# Altium footprint library ADNB95C.PcbLib: 249 footprints (part 13 of 16)
Each footprint in its own frame and in the unit in brackets; x right, y up, seen from the top. Pads: shape width x height; smd on the part's side, far side on the other; paste and mask are expansions set on the pad; w line width, h text height; cw(c..) or ccw(c..) is an arc to the next point about the centre after c.
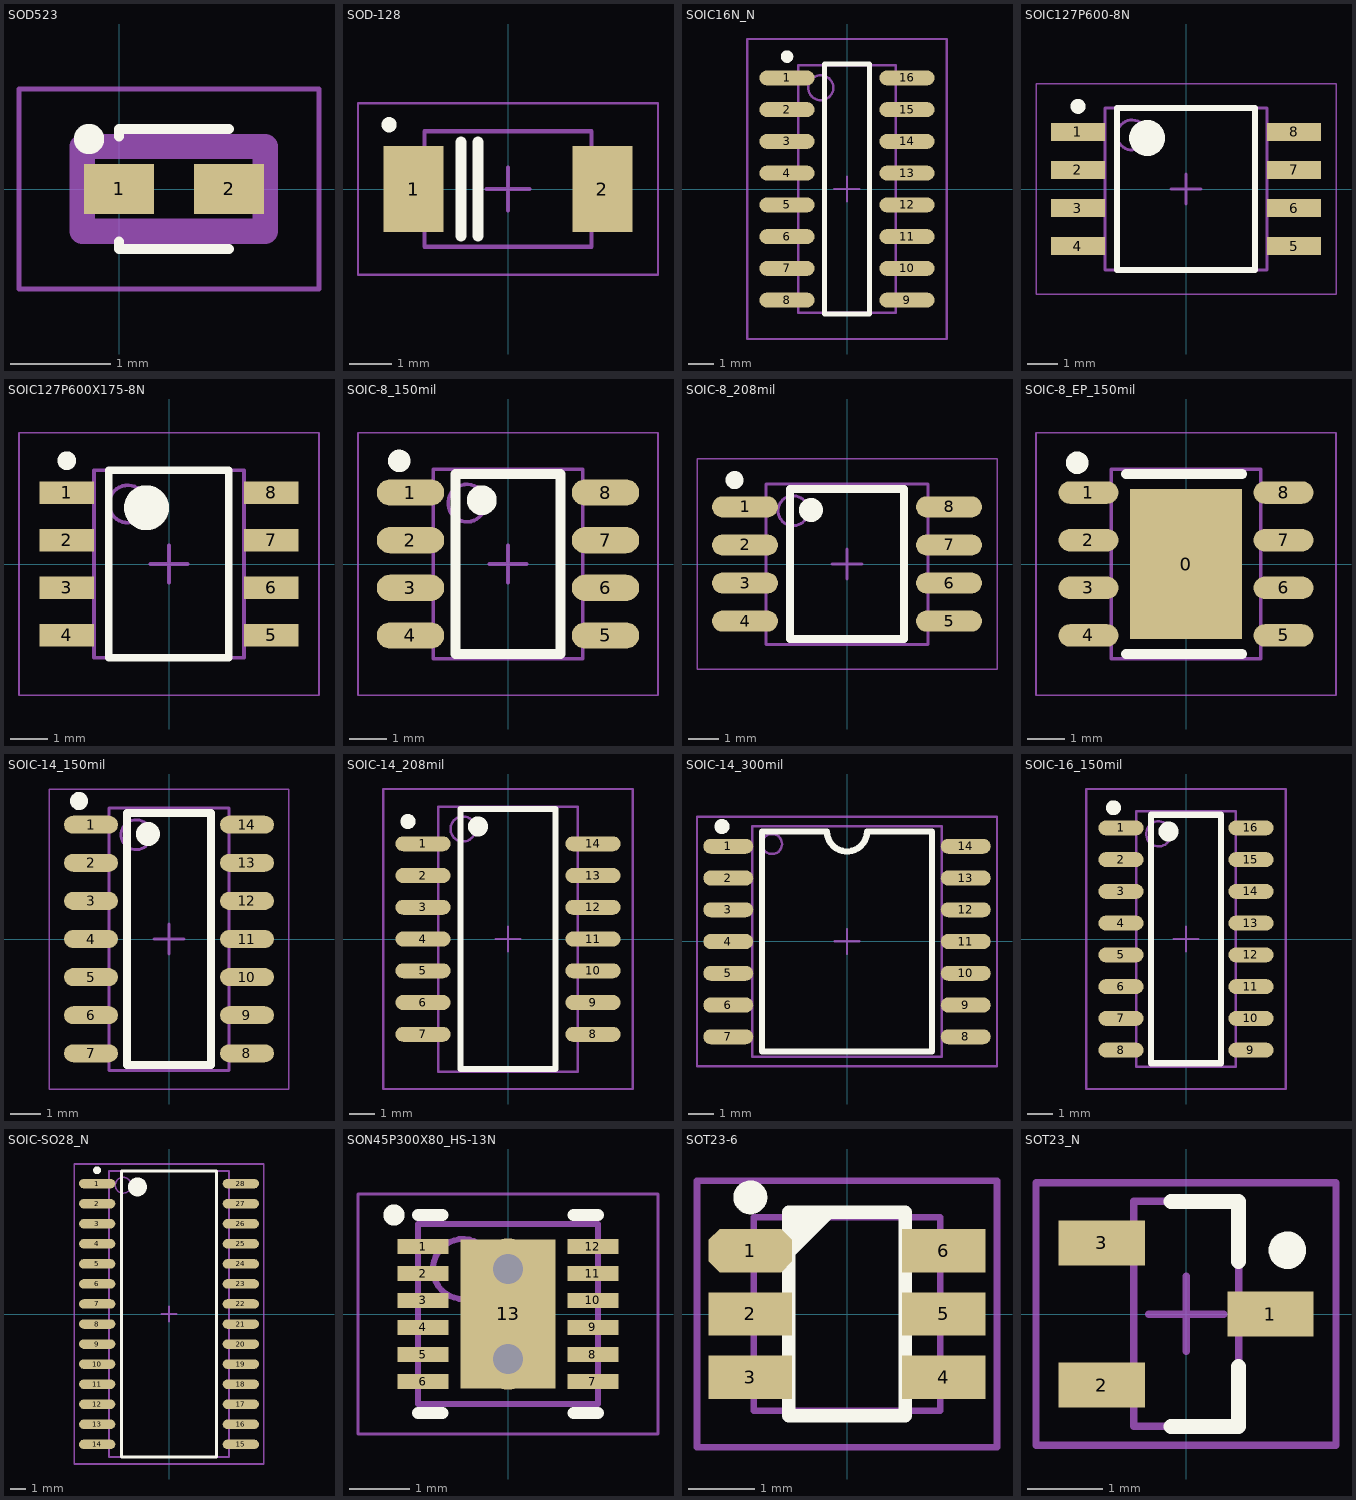
[diagram p12: the footprints below, top view; thin cyan lines are the x and y axes]

## SOD523 [mm]
height 11
pads (2):
  rect 0.7x0.5 smd: 1(0,0) 2(1.1,0)
Top Overlay:
  circle w0.254: c-0.3,0.5 r0.025
  lines w0.102: 0,-0.525 0,-0.6 1.1,-0.6 ; 0,0.525 0,0.6 1.1,0.6
Top Designator (Mech7):
  text ".Designator" at -3.809,-0.254 h0.76
Top Assembly:
  lines w0.254: -0.369,-0.424 -0.369,0.425 1.461,0.425 1.461,-0.424 -0.369,-0.424
Top Courtyard:
  lines w0.05: -1,-1 -1,1 2,1 2,-1 -1,-1
3D body "SW3dPS-SOD523.STEP": height 0.71, standoff 0, extent -0.369,-0.424 1.461,0.424

## SOD-128 [mm] "SODFL, 2-Leads, Body 2.50x4.70mm, IPC Medium Density"
height 1.05
pads (2):
  rect 1.4x2 smd: 1(-2.2,0) 2(2.2,0)
Top Overlay:
  circle w0.254: c-2.775,1.5 r0.05
  lines w0.254: -1.1,-1.1 -1.1,1.1 ; -0.7,-1.1 -0.7,1.1
Top Designator (Mech7):
  text ".Designator" at -6.094,-0.406 h1.22
Top Assembly:
  lines w0.1: -1.95,-1.35 -1.95,1.35 1.95,1.35 1.95,-1.35 -1.95,-1.35
Top Courtyard:
  lines w0.05: -3.5,-2 3.5,-2 3.5,2 -3.5,2 -3.5,-2
  lines w0.1: -0.5,0 0.5,0 ; 0,-0.5 0,0.5
3D body "User Library-SOD128.STEP": height 1.12, standoff 0.01, extent -2.5,-1.35 2.5,1.35

## SOIC16N_N [mm] "SOIC, 16-Leads, Body 9.9x3.9mm, Pitch 1.27mm, IPC Medium Density"
height 1.75
pads (16):
  oval 2.2x0.6 smd: 1(-2.4,4.445) 2(-2.4,3.175) 3(-2.4,1.905) 4(-2.4,0.635) 5(-2.4,-0.635) 6(-2.4,-1.905) 7(-2.4,-3.175) 8(-2.4,-4.445) 9(2.4,-4.445) 10(2.4,-3.175) 11(2.4,-1.905) 12(2.4,-0.635) 13(2.4,0.635) 14(2.4,1.905) 15(2.4,3.175) 16(2.4,4.445)
Top Overlay:
  circle w0.25: c-2.4,5.295 r0.125
  lines w0.2: -0.9,-5 -0.9,5 0.9,5 0.9,-5 -0.9,-5
Top Designator (Mech7):
  text ".Designator" at -7.618,-0.508 h1.52
Top Assembly:
  circle w0.1: c-1.05,4.05 r0.5
  lines w0.1: -1.95,-4.95 -1.95,4.95 1.95,4.95 1.95,-4.95 -1.95,-4.95
Top Courtyard:
  lines w0.1: -0.5,0 0.5,0 ; 0,-0.5 0,0.5 ; -4,-6 -4,6 4,6 4,-6 -4,-6
3D body "User Library-so16-2.STEP": height 1.78, standoff 0.01, extent -3.068,-4.985 3.068,4.985

## SOIC127P600-8N [mm]
height 2.16
pads (8):
  rect 1.8x0.6 smd: 1(-3.6,1.905) 2(-3.6,0.635) 3(-3.6,-0.635) 4(-3.6,-1.905) 5(3.6,-1.905) 6(3.6,-0.635) 7(3.6,0.635) 8(3.6,1.905)
Top Overlay:
  circle w0.6: c-1.3,1.7 r0.3
  circle w0.25: c-3.6,2.755 r0.125
  lines w0.2: -2.3,-2.7 2.3,-2.7 2.3,2.7 -2.3,2.7 -2.3,-2.7
Top Designator (Mech7):
  text ".Designator" at -7.618,-0.493 h1.52
Top Assembly:
  circle w0.1: c-1.8,1.8 r0.5
  lines w0.1: -2.7,-2.7 2.7,-2.7 2.7,2.7 -2.7,2.7 -2.7,-2.7
Top Courtyard:
  lines w0.05: -5,-3.5 5,-3.5 5,3.5 -5,3.5 -5,-3.5
  lines w0.1: -0.5,0 0.5,0 ; 0,-0.5 0,0.5
3D body "SOIC127P600-8N.step": height 2.16, standoff 0, extent -3.99,-2.7 3.99,2.7

## SOIC127P600X175-8N [mm] "SOIC, 8-Leads, Body 4.90x3.90mm, Pitch 1.27mm, IPC Medium Density"
height 1.75
pads (8):
  rect 1.45x0.6 smd: 1(-2.725,1.905) 2(-2.725,0.635) 3(-2.725,-0.635) 4(-2.725,-1.905) 5(2.725,-1.905) 6(2.725,-0.635) 7(2.725,0.635) 8(2.725,1.905)
Top Overlay:
  circle w0.6: c-0.6,1.5 r0.3
  circle w0.25: c-2.725,2.755 r0.125
  lines w0.2: -1.6,-2.5 1.6,-2.5 1.6,2.5 -1.6,2.5 -1.6,-2.5
Top Designator (Mech7):
  text ".Designator" at -7.618,-0.393 h1.52
Top Assembly:
  circle w0.1: c-1.1,1.6 r0.5
  lines w0.1: -2,-2.5 2,-2.5 2,2.5 -2,2.5 -2,-2.5
Top Courtyard:
  lines w0.05: -4,-3.5 4,-3.5 4,3.5 -4,3.5 -4,-3.5
  lines w0.1: -0.5,0 0.5,0 ; 0,-0.5 0,0.5
3D body "SOIC127P600X175-8N.step": height 1.75, standoff 0, extent -3,-2.5 3,2.5

## SOIC-8_150mil [mm]
pads (8):
  oval 1.8x0.7 smd: 1(-2.6,1.905) 2(-2.6,0.635) 3(-2.6,-0.635) 4(-2.6,-1.905) 5(2.6,-1.905) 6(2.6,-0.635) 7(2.6,0.635) 8(2.6,1.905)
Top Overlay:
  circle w0.4: c-0.7,1.7 r0.2
  circle w0.3: c-2.9,2.75 r0.15
  lines w0.254: -1.4,-2.4 1.4,-2.4 1.4,2.4 -1.4,2.4 -1.4,-2.4
Top Designator (Mech7):
  text ".Designator" at -7.618,-0.508 h1.52
Top Assembly:
  circle w0.1: c-1.095,1.625 r0.5
  lines w0.1: -1.995,-2.525 1.995,-2.525 1.995,2.525 -1.995,2.525 -1.995,-2.525
Top Courtyard:
  lines w0.05: -4,-3.5 4,-3.5 4,3.5 -4,3.5 -4,-3.5
  lines w0.1: -0.5,0 0.5,0 ; 0,-0.5 0,0.5
3D body "SOIC127P600X175-8N.step": height 1.75, standoff 0, extent -3,-2.5 3,2.5

## SOIC-8_208mil [mm]
pads (8):
  oval 2.2x0.7 smd: 1(-3.4,1.905) 2(-3.4,0.635) 3(-3.4,-0.635) 4(-3.4,-1.905) 5(3.4,-1.905) 6(3.4,-0.635) 7(3.4,0.635) 8(3.4,1.905)
Top Overlay:
  circle w0.3: c-3.75,2.797 r0.15
  circle w0.4: c-1.2,1.8 r0.2
  lines w0.254: -1.9,-2.5 1.9,-2.5 1.9,2.5 -1.9,2.5 -1.9,-2.5
Top Designator (Mech7):
  text ".Designator" at -7.618,-0.508 h1.52
Top Assembly:
  circle w0.1: c-1.8,1.775 r0.5
  lines w0.1: -2.7,-2.675 2.7,-2.675 2.7,2.675 -2.7,2.675 -2.7,-2.675
Top Courtyard:
  lines w0.05: -5,-3.5 -5,3.5 5,3.5 5,-3.5 -5,-3.5
  lines w0.1: -0.5,0 0.5,0 ; 0,-0.5 0,0.5
3D body "SOIC127P600-8N.step": height 2.16, standoff 0, extent -3.99,-2.7 3.99,2.7

## SOIC-8_EP_150mil [mm]
pads (9):
  rect 3x4 smd: 0(0,0)
  oval 1.6x0.6 smd: 1(-2.6,1.905) 2(-2.6,0.635) 3(-2.6,-0.635) 4(-2.6,-1.905) 5(2.6,-1.905) 6(2.6,-0.635) 7(2.6,0.635) 8(2.6,1.905)
Top Overlay:
  circle w0.3: c-2.9,2.7 r0.15
  lines w0.254: -1.6,-2.4 1.5,-2.4 ; -1.6,2.4 1.5,2.4
Top Designator (Mech7):
  text ".Designator" at -7.618,-0.508 h1.52
Top Assembly:
  lines w0.1: -1.995,-2.525 1.995,-2.525 1.995,2.525 -1.995,2.525 -1.995,-2.525
Top Courtyard:
  lines w0.05: -4,-3.5 4,-3.5 4,3.5 -4,3.5 -4,-3.5
  lines w0.1: -0.5,0 0.5,0 ; 0,-0.5 0,0.5
3D body "SOIC127P600X175-8N.step": height 1.75, standoff 0, extent -3,-2.5 3,2.5

## SOIC-14_150mil [mm]
pads (14):
  oval 1.8x0.6 smd: 1(-2.6,3.81) 2(-2.6,2.54) 3(-2.6,1.27) 4(-2.6,0) 5(-2.6,-1.27) 6(-2.6,-2.54) 7(-2.6,-3.81) 8(2.6,-3.81) 9(2.6,-2.54) 10(2.6,-1.27) 11(2.6,0) 12(2.6,1.27) 13(2.6,2.54) 14(2.6,3.81)
Top Overlay:
  circle w0.4: c-0.7,3.5 r0.2
  circle w0.3: c-3,4.6 r0.15
  lines w0.254: -1.4,-4.2 1.4,-4.2 1.4,4.2 -1.4,4.2 -1.4,-4.2
Top Designator (Mech7):
  text ".Designator" at -7.618,-0.508 h1.52
Top Assembly:
  circle w0.1: c-1.1,3.475 r0.5
  lines w0.1: -2,-4.375 2,-4.375 2,4.375 -2,4.375 -2,-4.375
Top Courtyard:
  lines w0.05: -4,-5 -4,5 4,5 4,-5 -4,-5
  lines w0.1: -0.5,0 0.5,0 ; 0,-0.5 0,0.5
3D body "SOIC127P600X135-14N.step": height 1.35, standoff 0, extent -2.997,-4.35 2.997,4.35

## SOIC-14_208mil [mm]
pads (14):
  oval 2.2x0.6 smd: 1(-3.4,3.81) 2(-3.4,2.54) 3(-3.4,1.27) 4(-3.4,0) 5(-3.4,-1.27) 6(-3.4,-2.54) 7(-3.4,-3.81) 8(3.4,-3.81) 9(3.4,-2.54) 10(3.4,-1.27) 11(3.4,0) 12(3.4,1.27) 13(3.4,2.54) 14(3.4,3.81)
Top Overlay:
  circle w0.4: c-1.2,4.5 r0.2
  circle w0.3: c-4,4.7 r0.15
  lines w0.254: -1.9,-5.2 -1.9,5.2 1.9,5.2 1.9,-5.2 -1.9,-5.2
Top Designator (Mech7):
  text ".Designator" at -7.618,-0.508 h1.52
Top Assembly:
  circle w0.1: c-1.8,4.4 r0.5
  lines w0.1: -2.8,-5.3 -2.8,5.3 2.8,5.3 2.8,-5.3 -2.8,-5.3
Top Courtyard:
  lines w0.1: -0.5,0 0.5,0 ; 0,-0.5 0,0.5 ; -5,-6 -5,6 5,6 5,-6 -5,-6

## SOIC-14_300mil [mm]
pads (14):
  oval 2x0.6 smd: 1(-4.75,3.81) 2(-4.75,2.54) 3(-4.75,1.27) 4(-4.75,0) 5(-4.75,-1.27) 6(-4.75,-2.54) 7(-4.75,-3.81) 8(4.75,-3.81) 9(4.75,-2.54) 10(4.75,-1.27) 11(4.75,0) 12(4.75,1.27) 13(4.75,2.54) 14(4.75,3.81)
Top Overlay:
  circle w0.3: c-5,4.6 r0.15
  lines w0.254: -3.4,-4.4 -3.4,4.4 -0.8,4.4 ccw(c0,4.4) 0.8,4.4 3.4,4.4 3.4,-4.4 -3.4,-4.4
Top Designator (Mech7):
  text ".Designator" at -7.618,-0.508 h1.52
Top Assembly:
  circle w0.1: c-3,3.9 r0.4
  lines w0.1: -3.8,-4.6 -3.8,4.6 3.8,4.6 3.8,-4.6 -3.8,-4.6
Top Courtyard:
  lines w0.1: -0.5,0 0.5,0 ; 0,-0.5 0,0.5 ; -6,-5 -6,5 6,5 6,-5 -6,-5

## SOIC-16_150mil [mm]
pads (16):
  oval 1.8x0.6 smd: 1(-2.6,4.445) 2(-2.6,3.175) 3(-2.6,1.905) 4(-2.6,0.635) 5(-2.6,-0.635) 6(-2.6,-1.905) 7(-2.6,-3.175) 8(-2.6,-4.445) 9(2.6,-4.445) 10(2.6,-3.175) 11(2.6,-1.905) 12(2.6,-0.635) 13(2.6,0.635) 14(2.6,1.905) 15(2.6,3.175) 16(2.6,4.445)
Top Overlay:
  circle w0.3: c-2.9,5.25 r0.15
  circle w0.4: c-0.7,4.3 r0.2
  lines w0.254: -1.4,-4.975 -1.4,4.975 1.4,4.975 1.4,-4.975 -1.4,-4.975
Top Designator (Mech7):
  text ".Designator" at -7.618,-0.508 h1.52
Top Assembly:
  circle w0.1: c-1.095,4.205 r0.5
  lines w0.1: -1.995,-5.105 -1.995,5.105 1.995,5.105 1.995,-5.105 -1.995,-5.105
Top Courtyard:
  lines w0.1: -0.5,0 0.5,0 ; 0,-0.5 0,0.5 ; -4,-6 4,-6 4,6 -4,6 -4,-6
3D body "User Library-SOIC127P600X175-16.STEP": height 1.65, standoff 0, extent -3.01,-5 3.07,5

## SOIC-SO28_N [mm] "SOIC, 28-Leads, Body 17.9x7.5mm, Pitch 1.27mm, IPC Medium Density"
height 2.65
pads (28):
  oval 2.3x0.6 smd: 1(-4.55,8.255) 2(-4.55,6.985) 3(-4.55,5.715) 4(-4.55,4.445) 5(-4.55,3.175) 6(-4.55,1.905) 7(-4.55,0.635) 8(-4.55,-0.635) 9(-4.55,-1.905) 10(-4.55,-3.175) 11(-4.55,-4.445) 12(-4.55,-5.715) 13(-4.55,-6.985) 14(-4.55,-8.255) 15(4.55,-8.255) 16(4.55,-6.985) 17(4.55,-5.715) 18(4.55,-4.445) 19(4.55,-3.175) 20(4.55,-1.905) 21(4.55,-0.635) 22(4.55,0.635) 23(4.55,1.905) 24(4.55,3.175) 25(4.55,4.445) 26(4.55,5.715) 27(4.55,6.985) 28(4.55,8.255)
Top Overlay:
  circle w0.6: c-2,8.05 r0.3
  circle w0.25: c-4.55,9.105 r0.125
  lines w0.2: -3,-9.05 3,-9.05 3,9.05 -3,9.05 -3,-9.05
Top Designator (Mech7):
  text ".Designator" at -7.618,-0.505 h1.52
Top Assembly:
  circle w0.1: c-2.9,8.155 r0.5
  lines w0.1: -3.8,-9.055 3.8,-9.055 3.8,9.055 -3.8,9.055 -3.8,-9.055
Top Courtyard:
  lines w0.1: -0.5,0 0.5,0 ; 0,-0.5 0,0.5 ; -6,-9.5 6,-9.5 6,9.5 -6,9.5 -6,-9.5
3D body "User Library-SOIC-28-300.STEP": height 2.61, standoff 0.01, extent -5.3,-9.05 5.3,9.05

## SON45P300X80_HS-13N [mm] "SON, 12-Leads, Body 3.00x3.00mm, Pitch 0.45mm, Thermal Pad 2.48x1.58mm, IPC Medium Density"
height 0.8
pads (13):
  rect 0.85x0.25 smd: 1(-1.415,1.125) 2(-1.415,0.675) 3(-1.415,0.225) 4(-1.415,-0.225) 5(-1.415,-0.675) 6(-1.415,-1.125) 7(1.415,-1.125) 8(1.415,-0.675) 9(1.415,-0.225) 10(1.415,0.225) 11(1.415,0.675) 12(1.415,1.125)
  rect 1.58x2.48 smd: 13(0,0)
via 0,-0.75 diameter 1.016 hole 0.508
via 0,0.75 diameter 1.016 hole 0.508
Top Overlay:
  circle w0.254: c-1.9,1.65 r0.05
  lines w0.2: -1.5,-1.65 -1.09,-1.65 ; -1.5,1.65 -1.09,1.65 ; 1.09,-1.65 1.5,-1.65 ; 1.09,1.65 1.5,1.65
Top Designator (Mech7):
  text ".Designator" at -7.618,-0.482 h1.52
Top Assembly:
  circle w0.1: c-0.75,0.75 r0.5
  lines w0.1: -1.5,-1.5 1.5,-1.5 1.5,1.5 -1.5,1.5 -1.5,-1.5
Top Courtyard:
  lines w0.05: -2.5,-2 2.5,-2 2.5,2 -2.5,2 -2.5,-2
  lines w0.1: -0.5,0 0.5,0 ; 0,-0.5 0,0.5
3D body: height 0.8, standoff 0.1, extent -1.5,-1.5 1.5,1.5

## SOT23-6 [mm]
pads (6):
  oct 1.25x0.65 smd: 1(-1.45,0.95)
  rect 1.25x0.65 smd: 2(-1.45,0) 3(-1.45,-0.95) 4(1.45,-0.95) 5(1.45,0) 6(1.45,0.95)
Top Overlay:
  circle w0.254: c-1.45,1.75 r0.127
  lines w0.2: -0.875,0.925 -0.275,1.525 ; -0.875,1.025 -0.375,1.525 ; -0.875,1.125 -0.475,1.525 ; -0.875,1.225 -0.575,1.525 ; -0.875,1.325 -0.675,1.525 ; -0.875,1.425 -0.775,1.525 ; -0.875,-1.525 0.875,-1.525 0.875,1.525 -0.875,1.525 -0.875,-1.525
Top Designator (Mech7):
  text ".Designator" at -3.809,-0.254 h0.76
Top Assembly:
  lines w0.1: -1.4,-1.45 -1.4,1.45 1.4,1.45 1.4,-1.45 -1.4,-1.45
Top Courtyard:
  lines w0.1: -2.25,-2 -2.25,2 2.25,2 2.25,-2 -2.25,-2
3D body "User Library-SOT23-6-2.STEP": height 1.45, standoff 0, extent -1.4,-1.45 1.4,1.45

## SOT23_N [mm] "SOT23, 3-Leads, Body 2.9x1.3mm, Pitch 0.95mm, Lead Span 2.3mm - Reverse Pinning, IPC Medium Density"
height 1.1
pads (3):
  rect 1.15x0.6 smd: 1(1.125,0) 2(-1.125,-0.95) 3(-1.125,0.95)
Top Overlay:
  circle w0.25: c1.35,0.85 r0.125
  lines w0.2: -0.2,-1.5 0.7,-1.5 0.7,-0.7 ; -0.2,1.5 0.7,1.5 0.7,0.7
Top Designator (Mech7):
  text ".Designator" at -3.809,-0.254 h0.76
Top Assembly:
  lines w0.1: -0.7,-1.5 -0.7,1.5 0.7,1.5 0.7,-1.5 -0.7,-1.5
Top Courtyard:
  lines w0.1: -0.5,0 0.5,0 ; 0,-0.5 0,0.5 ; -2,-1.75 -2,1.75 2,1.75 2,-1.75 -2,-1.75
3D body "alsrobot-SOT23.STEP": height 1.08, standoff 0, extent -1.32,-1.5 1.32,1.5